# Altium footprint library MB1404.PcbLib: 69 footprints (part 4 of 5)
Each footprint in its own frame and in the unit in brackets; x right, y up, seen from the top. Pads: shape width x height; smd on the part's side, far side on the other; paste and mask are expansions set on the pad; w line width, h text height; cw(c..) or ccw(c..) is an arc to the next point about the centre after c.
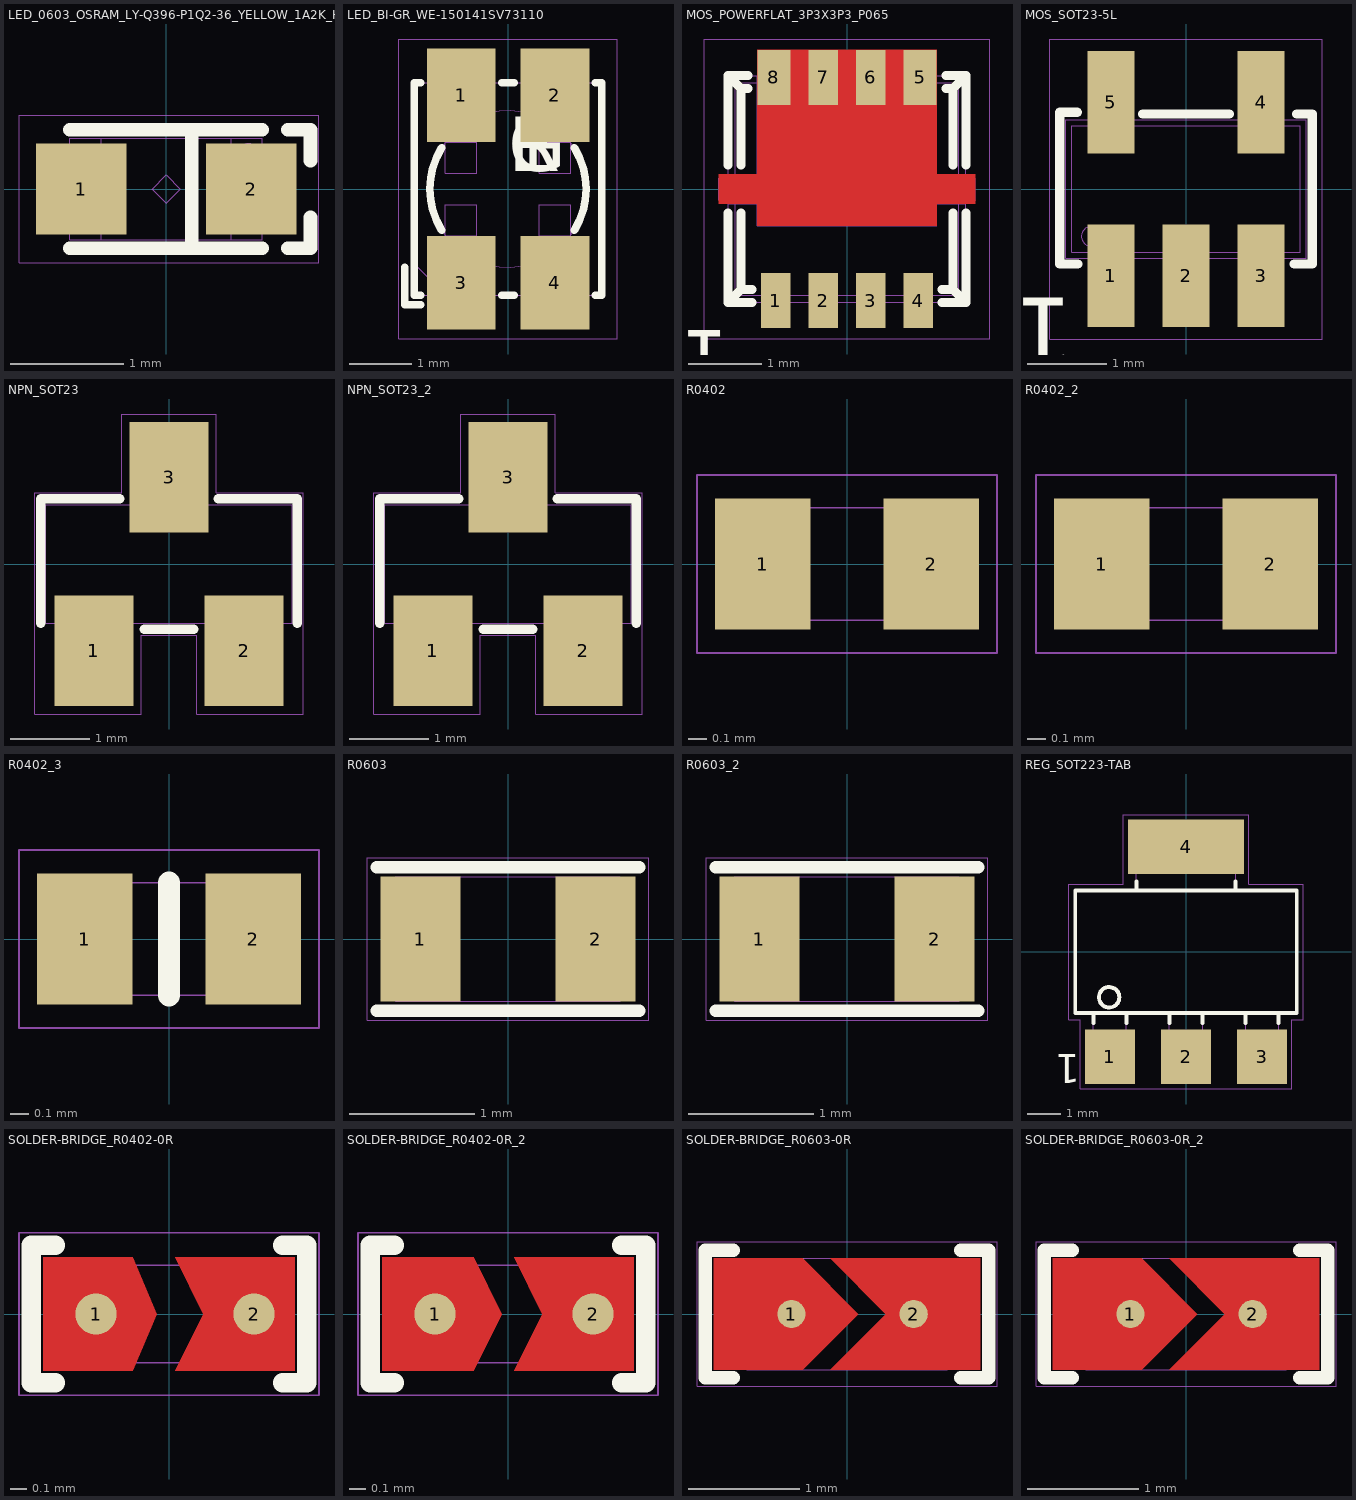
[diagram p3: the footprints below, top view; thin cyan lines are the x and y axes]

## LED_0603_OSRAM_LY-Q396-P1Q2-36_YELLOW_1A2K_H0P4 [mm]
height 0.4
pads (2):
  rect 0.8x0.8 smd mask+0.05: 1(-0.75,0) 2(0.75,0)
Top Overlay:
  lines w0.12: -0.85,-0.525 0.85,-0.525 ; -0.85,0.525 0.85,0.525 ; 0.225,-0.525 0.225,0.525 ; 1.075,-0.525 1.275,-0.525 1.275,-0.25 ; 1.075,0.525 1.275,0.525 1.275,0.25
Mechanical 14:
  circle w0.01: c0.725,0.3 r0.1
  lines w0.01: -0.575,-0.45 -0.575,0.45 ; 0.575,-0.45 0.575,0.45 ; -0.85,-0.45 -0.85,0.45 0.85,0.45 0.85,-0.45 -0.85,-0.45 ; -0.125,0 0,-0.125 0.125,0 0,0.125 -0.125,0
  text "K" at 0.9,-0.25 h0.75
  text "'.Designator'" at -4.528,-0.808 h0.75
Mechanical 16:
  lines w0.01: -1.3,-0.65 -1.3,0.65 -0.475,0.65 1.35,0.65 1.35,-0.65 -1.3,-0.65
3D body: height 0.1, standoff 0, extent -0.85,0.4 0.85,0.45
3D body: height 0.1, standoff 0, extent -0.85,-0.45 0.85,-0.4
3D body: height 0.1, standoff 0, extent -0.85,-0.4 -0.575,0.4
3D body: height 0.1, standoff 0, extent 0.575,-0.4 0.85,0.4
3D body: height 0.4, standoff 0, extent -0.575,-0.4 0.575,0.4
3D body: height 0.2, standoff 0, extent -0.35,-0.275 0.35,0.3

## LED_BI-GR_WE-150141SV73110 [mm] "MCD-02631"
height 2.1
pads (4):
  rect 1.1x1.5 smd mask+0.05: 1(-0.75,1.5) 2(0.75,1.5) 3(-0.75,-1.5) 4(0.75,-1.5)
Top Overlay:
  lines w0.12: -1.65,-1.25 -1.65,-1.85 -1.4,-1.85 ; -1.4,-1.7 -1.5,-1.7 -1.5,1.7 -1.4,1.7 ; -1.063,-0.658 cw(c0,0) -1.063,0.658 ; -0.1,-1.7 0.1,-1.7 ; -0.1,1.7 0.1,1.7 ; 1.063,-0.658 ccw(c0,0) 1.063,0.658 ; 1.4,-1.7 1.5,-1.7 1.5,1.7 1.4,1.7
  text "1" at 0,0 h1.5
  text "G" at 0,0 h1.5
  text "R" at 0,0 h1.5
Mechanical 14:
  circle w0.01: c0,0 r1.25
  lines w0.01: -1.5,-1.2 -1,-1.7 ; -1.15,-1.7 -1.15,-1.85 -0.35,-1.85 -0.35,-1.7 ; -1.15,1.7 -1.15,1.75 -1.15,1.85 -0.35,1.85 -0.35,1.75 -0.35,1.7 ; 0.35,-1.7 0.35,-1.75 0.35,-1.85 1.15,-1.85 1.15,-1.75 1.15,-1.7 ; 0.35,1.7 0.35,1.85 1.15,1.85 1.15,1.7 ; -1.5,-1.7 1.5,-1.7 1.5,1.7 -1.5,1.7 -1.5,-1.7 ; -1,-0.75 -1,-0.25 -0.5,-0.25 -0.5,-0.75 -1,-0.75 ; -1,0.25 -1,0.75 -0.5,0.75 -0.5,0.25 -1,0.25 ; 0.5,-0.75 1,-0.75 1,-0.25 0.5,-0.25 0.5,-0.75 ; 0.5,0.25 0.5,0.75 1,0.75 1,0.25 0.5,0.25
  text "R" at 0,0 h1.5
  text "'.Designator'" at 1.975,-0.421 h0.75
  text "G" at 0,0 h1.5
Mechanical 16:
  lines w0.01: -1.75,-2.4 -1.75,2.4 1.75,2.4 1.75,-2.4 -1.75,-2.4
3D body: height 2.1, standoff 1.7, extent -0.575,-0.725 -0.075,-0.225
3D body: height 2.1, standoff 1.7, extent 0.075,0.225 0.575,0.725
3D body: height 0.2, standoff 0, extent -1.15,0.75 -0.35,1.85
3D body: height 0.2, standoff 0, extent 0.35,0.75 1.15,1.85
3D body: height 0.2, standoff 0, extent 0.35,-1.85 1.15,-0.75
3D body: height 0.2, standoff 0, extent -1.15,-1.85 -0.35,-0.75
3D body: height 1, standoff 0, extent 0.35,-1.85 1.15,-1.7
3D body: height 1, standoff 0, extent -1.15,-1.85 -0.35,-1.7
3D body: height 1, standoff 0, extent -1.15,1.7 -0.35,1.85
3D body: height 1, standoff 0, extent 0.35,1.7 1.15,1.85
3D body: height 0.2, standoff 0.1, extent -1.5,-1.7 1.5,1.7
3D body: height 1.7, standoff 0.2, extent -1.5,-1.7 1.5,1.7
3D body: height 1.75, standoff 1.7, extent -0.575,-0.725 -0.075,-0.225
3D body: height 1.75, standoff 1.7, extent 0.075,0.225 0.575,0.725
3D body: height 2.1, standoff 1.7, extent 0,-1.7 1.5,1.7
3D body: height 2.1, standoff 1.7, extent -1.5,-1.7 0,1.7

## MOS_POWERFLAT_3P3X3P3_P065 [mm] "MCD-01126"
height 0.9
pads (8):
  rect 0.4x0.75 smd mask+0.05: 1(-0.975,-1.525) 2(-0.325,-1.525) 3(0.325,-1.525) 4(0.975,-1.525) 6(0.325,1.525) 7(-0.325,1.525)
  rect 0.45x0.75 smd mask+0.05: 5(1,1.525) 8(-1,1.525)
Top Layer:
  region: -1.755,0.2 -1.755,-0.2 -1.225,-0.2 -1.225,-0.5 1.225,-0.5 1.225,-0.2 1.755,-0.2 1.755,0.2 1.225,0.2 1.225,1.9 -1.225,1.9 -1.225,0.2
Top Overlay:
  lines w0.12: -1.625,-0.325 -1.625,-1.55 ; -1.625,0.325 -1.625,1.55 ; -1.45,-0.325 -1.45,-1.375 ; -1.45,0.325 -1.45,1.375 ; -1.35,1.375 -1.45,1.375 ; -1.35,1.55 -1.625,1.55 ; -1.3,-1.55 -1.625,-1.55 ; -1.3,-1.375 -1.45,-1.375 ; 1.3,-1.55 1.625,-1.55 ; 1.3,-1.375 1.45,-1.375 ; 1.35,1.375 1.45,1.375 ; 1.35,1.55 1.625,1.55 ; 1.45,-0.325 1.45,-1.375 ; 1.45,0.325 1.45,1.375 ; 1.625,-0.325 1.625,-1.55 ; 1.625,0.325 1.625,1.55 ; -1.625,-1.55 -1.45,-1.375 ; -1.625,1.55 -1.45,1.375 ; -1.45,-1.375 -1.45,-1.375 ; 1.45,-1.375 1.45,-1.375 ; 1.45,-1.375 1.625,-1.55 ; 1.45,1.375 1.625,1.55
  text "1" at -1.6,-1.675 h1.3
Mechanical 14:
  lines w0.01: -1.625,-0.15 -1.75,-0.15 -1.75,0.15 -1.625,0.15 ; -1.125,-1.55 -1.125,-1.75 -0.825,-1.75 -0.825,-1.55 ; -1.125,1.55 -1.125,1.75 -0.825,1.75 -0.825,1.55 ; -0.475,-1.55 -0.475,-1.75 -0.175,-1.75 -0.175,-1.55 ; -0.475,1.55 -0.475,1.75 -0.175,1.75 -0.175,1.55 ; 0.175,-1.55 0.175,-1.75 0.475,-1.75 0.475,-1.55 ; 0.175,1.55 0.175,1.75 0.475,1.75 0.475,1.55 ; 0.825,-1.55 0.825,-1.75 1.125,-1.75 1.125,-1.55 ; 0.825,1.55 0.825,1.75 1.125,1.75 1.125,1.55 ; 1.625,-0.15 1.75,-0.15 1.75,0.15 1.625,0.15 ; -1.625,-1.55 1.625,-1.55 ; -1.625,-1.55 -1.625,1.55 ; -1.625,-1.55 -1.525,-1.45 ; -1.625,1.55 1.625,1.55 ; -1.625,1.55 -1.525,1.45 ; -1.525,-1.45 -1.525,1.45 ; -1.525,-1.45 -1.45,-1.45 1.525,-1.45 ; -1.525,1.45 1.525,1.45 ; 1.525,-1.45 1.525,1.45 ; 1.525,-1.45 1.625,-1.55 ; 1.525,1.45 1.625,1.55 ; 1.625,-1.55 1.625,1.55 ; -1.625,-0.2 -1.225,-0.2 -1.225,-0.5 0,-0.5 1.225,-0.5 1.225,-0.2 1.625,-0.2 1.625,0.2 1.225,0.2 1.225,1.55 -0.35,1.55 -1.225,1.55 -1.225,0.2 -1.625,0.2 -1.625,-0.2
  text "8" at -1.075,1.075 h0.5
  text "7" at -0.425,1.075 h0.5
  text "6" at 0.225,1.075 h0.5
  text "5" at 0.9,1.075 h0.5
  text "4" at 0.85,-1.4 h0.5
  text "3" at 0.225,-1.4 h0.5
  text "2" at -0.425,-1.4 h0.5
  text "1" at -1.05,-1.4 h0.5
  text "'.Designator'" at 0.8,-4.25 h0.75
Mechanical 16:
  lines w0.01: 1.95,-2.05 -1.075,-2.05 -1.95,-2.05 -1.95,-0.225 -1.95,2.05 1.5,2.05 1.95,2.05 1.95,-2.05 ; 1.95,-2.05 1.95,-2.05
3D body: height 0.2, standoff 0, extent -1.125,1.55 -0.825,1.75
3D body: height 0.2, standoff 0, extent -0.475,1.55 -0.175,1.75
3D body: height 0.2, standoff 0, extent 0.175,1.55 0.475,1.75
3D body: height 0.2, standoff 0, extent 0.825,1.55 1.125,1.75
3D body: height 0.2, standoff 0, extent 0.825,-1.75 1.125,-1.55
3D body: height 0.2, standoff 0, extent 0.175,-1.75 0.475,-1.55
3D body: height 0.2, standoff 0, extent -0.475,-1.75 -0.175,-1.55
3D body: height 0.2, standoff 0, extent -1.125,-1.75 -0.825,-1.55
3D body: height 0.2, standoff 0, extent -1.75,-0.15 -1.625,0.15
3D body: height 0.9, standoff 0, extent -1.625,-1.55 1.625,1.55
3D body: height 0.2, standoff 0, extent 1.625,-0.15 1.75,0.15
3D body: height 0.91, standoff 0.9, extent -1.398,-1.325 -1,-0.925

## MOS_SOT23-5L [mm]
height 1.45
pads (5):
  rect 0.6x1.3 smd mask+0.05: 1(-0.95,-1.1) 2(0,-1.1) 3(0.95,-1.1) 4(0.95,1.1) 5(-0.95,1.1)
Top Overlay:
  lines w0.12: -1.375,0.975 -1.6,0.975 -1.6,-0.95 -1.372,-0.95 ; -0.55,0.95 0.55,0.95 ; 1.372,-0.95 1.6,-0.95 1.6,0.95 1.4,0.95
  text "1" at -1.409,-1.086 h1.5
Mechanical 14:
  circle w0.01: c-1.2,-0.6 r0.125
  lines w0.01: -1.15,-0.875 -1.15,-1.5 -0.75,-1.5 -0.75,-0.875 ; -1.15,0.875 -1.15,1.5 -0.75,1.5 -0.75,0.875 ; -0.2,-0.875 -0.2,-1.5 0.2,-1.5 0.2,-0.875 ; 0.75,-0.875 0.75,-1.5 1.15,-1.5 1.15,-0.875 ; 0.75,0.875 0.75,1.5 1.15,1.5 1.15,0.875 ; -1.525,-0.875 -1.525,0.875 1.525,0.875 1.525,-0.875 -1.525,-0.875 ; -1.45,-0.8 1.45,-0.8 1.45,0.8 -1.45,0.8 -1.45,-0.8
  text "'.Designator'" at 4.441,0.814 h0.75
Mechanical 16:
  lines w0.01: -1.725,-1.9 -1.725,1.9 1.725,1.9 1.725,-1.9 -1.725,-1.9
3D body "SOT23-5L.STEP": height 1.1, standoff 0, extent -1.5,-1.25 1.5,1.25
3D body: height 1.45, standoff 0, extent -1.524,-0.874 1.524,0.874

## NPN_SOT23 [mm]
height 1.1
pads (3):
  rect 1x1.4 smd mask+0.05: 1(-0.95,-1.1) 2(0.95,-1.1) 3(0,1.1)
Top Overlay:
  lines w0.12: -1.625,-0.75 -1.625,0.825 -0.624,0.825 ; -0.312,-0.825 0.312,-0.825 ; 0.624,0.825 1.625,0.825 1.625,-0.75
Mechanical 14:
  lines w0.01: -1.56,-0.75 1.56,-0.75 1.56,0.75 -1.56,0.75 -1.56,-0.75 ; -1.275,-1.025 -1.275,-0.75 -0.675,-0.75 -0.675,-1.025 -1.275,-1.025 ; -0.25,0.75 -0.25,1.05 0.325,1.05 0.325,0.75 -0.25,0.75 ; 0.65,-1.025 0.65,-0.75 1.25,-0.75 1.25,-1.025 0.65,-1.025
  text "'.Designator'" at -4.325,-0.775 h0.75
Mechanical 16:
  lines w0.01: -1.7,-1.9 -1.7,0.9 -0.6,0.9 -0.6,1.9 0.6,1.9 0.6,0.9 1.7,0.9 1.7,-1.9 0.35,-1.9 0.35,-0.9 -0.35,-0.9 -0.35,-1.9 -1.7,-1.9
3D body "SOT23-3_TO-236AB.STEP": height 1.09, standoff 0, extent -1.5,-1.25 1.5,1.25
3D body: height 1.1, standoff 0, extent -1.559,-0.749 1.559,0.749

## NPN_SOT23_2 [mm]
pads (3):
  rect 1x1.4 smd mask+0.05: 1(-0.95,-1.1) 2(0.95,-1.1) 3(0,1.1)
Top Overlay:
  lines w0.12: -1.625,-0.75 -1.625,0.825 -0.624,0.825 ; -0.312,-0.825 0.312,-0.825 ; 0.624,0.825 1.625,0.825 1.625,-0.75
Mechanical 14:
  lines w0.01: -1.56,-0.75 1.56,-0.75 1.56,0.75 -1.56,0.75 -1.56,-0.75 ; -1.275,-1.025 -1.275,-0.75 -0.675,-0.75 -0.675,-1.025 -1.275,-1.025 ; -0.25,0.75 -0.25,1.05 0.325,1.05 0.325,0.75 -0.25,0.75 ; 0.65,-1.025 0.65,-0.75 1.25,-0.75 1.25,-1.025 0.65,-1.025
  text "'.Designator'" at -4.325,-0.775 h0.75
Mechanical 16:
  lines w0.01: -1.7,-1.9 -1.7,0.9 -0.6,0.9 -0.6,1.9 0.6,1.9 0.6,0.9 1.7,0.9 1.7,-1.9 0.35,-1.9 0.35,-0.9 -0.35,-0.9 -0.35,-1.9 -1.7,-1.9
3D body "SOT23-3_TO-236AB.STEP": height 1.09, standoff 0, extent -1.5,-1.25 1.5,1.25
3D body: height 1.1, standoff 0, extent -1.559,-0.749 1.559,0.749

## R0402 [mm]
height 0.4
pads (2):
  rect 0.51x0.7 smd mask+0.05: 1(-0.45,0) 2(0.45,0)
Mechanical 14:
  lines w0.01: -0.45,-0.3 0.45,-0.3 0.45,0.3 -0.45,0.3 -0.45,-0.3
  text "'.Designator'" at -2,-0.5 h0.75
Mechanical 16:
  lines w0.01: -0.8,-0.475 -0.8,0.475 0.8,0.475 0.8,-0.475 -0.8,-0.475
3D body "R0402.STEP": height 0.34, standoff 0, extent -0.52,-0.3 0.52,0.3
3D body: height 0.4, standoff 0, extent -0.455,-0.305 0.455,0.305

## R0402_2 [mm]
pads (2):
  rect 0.51x0.7 smd mask+0.05: 1(-0.45,0) 2(0.45,0)
Mechanical 14:
  lines w0.01: -0.45,-0.3 0.45,-0.3 0.45,0.3 -0.45,0.3 -0.45,-0.3
  text "'.Designator'" at 1.925,0.475 h0.75
Mechanical 16:
  lines w0.01: -0.8,-0.475 -0.8,0.475 0.8,0.475 0.8,-0.475 -0.8,-0.475
3D body "R0402.STEP": height 0.34, standoff 0, extent -0.52,-0.3 0.52,0.3
3D body: height 0.4, standoff 0, extent -0.455,-0.305 0.455,0.305

## R0402_3 [mm]
pads (2):
  rect 0.51x0.7 smd mask+0.05: 1(-0.45,0) 2(0.45,0)
Top Overlay:
  lines w0.12: 0,-0.3 0,0.3
Mechanical 14:
  lines w0.01: -0.45,-0.3 -0.45,0.3 0.45,0.3 0.45,-0.3 -0.45,-0.3
  text "'.Designator'" at 4.404,0.834 h0.75
Mechanical 16:
  lines w0.01: -0.8,-0.475 0.8,-0.475 0.8,0.475 -0.8,0.475 -0.8,-0.475
3D body: height 0.4, standoff 0, extent -0.455,-0.305 0.455,0.305
3D body "R0402.STEP": height 0.34, standoff 0, extent -0.52,-0.3 0.52,0.3

## R0603 [mm]
height 0.55
pads (2):
  rect 0.64x1 smd mask+0.05: 1(-0.7,0) 2(0.7,0)
Top Overlay:
  lines w0.1: -1.05,-0.575 1.05,-0.575 ; -1.05,0.575 1.05,0.575
Top Paste:
  rectangle: -1.02,-0.5 -0.38,0.5
  rectangle: 0.38,-0.5 1.02,0.5
Mechanical 14:
  lines w0.01: -0.9,-0.5 -0.9,0.5 0.9,0.5 0.9,-0.5 -0.9,-0.5
  text "'.Designator'" at 4.459,0.829 h0.75
Mechanical 16:
  lines w0.01: -1.125,-0.65 1.125,-0.65 1.125,0.65 -1.125,0.65 -1.125,-0.65
3D body "R0603.STEP": height 0.56, standoff 0, extent -0.85,-0.4 0.85,0.4
3D body: height 0.55, standoff 0, extent -0.905,-0.505 0.905,0.505

## R0603_2 [mm]
pads (2):
  rect 0.64x1 smd mask+0.05: 1(-0.7,0) 2(0.7,0)
Top Overlay:
  lines w0.1: -1.05,-0.575 1.05,-0.575 ; -1.05,0.575 1.05,0.575
Top Paste:
  rectangle: -1.02,-0.5 -0.38,0.5
  rectangle: 0.38,-0.5 1.02,0.5
Mechanical 14:
  lines w0.01: -0.9,-0.5 -0.9,0.5 0.9,0.5 0.9,-0.5 -0.9,-0.5
  text "'.Designator'" at 4.461,0.767 h0.75
Mechanical 16:
  lines w0.01: -1.125,-0.65 1.125,-0.65 1.125,0.65 -1.125,0.65 -1.125,-0.65
3D body "R0603.STEP": height 0.56, standoff 0, extent -0.85,-0.4 0.85,0.4
3D body: height 0.55, standoff 0, extent -0.905,-0.505 0.905,0.505

## REG_SOT223-TAB [mm]
height 1.8
pads (4):
  rect 1.5x1.65 smd mask+0.05: 1(-2.3,-3.175) 2(0,-3.175) 3(2.3,-3.175)
  rect 3.5x1.65 smd mask+0.05: 4(0,3.175)
Top Overlay:
  circle w0.12: c-2.325,-1.375 r0.309
  lines w0.12: -2.8,-2.15 -2.8,-1.85 -1.8,-1.85 -1.8,-2.15 ; -1.5,2.125 -1.5,1.85 1.5,1.85 1.5,2.125 ; -0.5,-2.15 -0.5,-1.85 0.5,-1.85 0.5,-2.15 ; 1.8,-2.15 1.8,-1.85 2.8,-1.85 2.8,-2.15 ; -3.35,-1.85 3.35,-1.85 3.35,1.85 -3.35,1.85 -3.35,-1.85
  text "1" at -3.196,-2.816 h1.5
Mechanical 14:
  circle w0.01: c-2.325,-1.375 r0.285
  lines w0.01: -3.35,-1.85 3.35,-1.85 3.35,1.85 -3.35,1.85 -3.35,-1.85 ; -2.8,-3.65 -2.8,-1.85 -1.8,-1.85 -1.8,-3.65 -2.8,-3.65 ; -1.5,1.85 -1.5,3.65 1.5,3.65 1.5,1.85 -1.5,1.85 ; -0.5,-3.65 -0.5,-1.85 0.5,-1.85 0.5,-3.65 -0.5,-3.65 ; 1.8,-3.65 1.8,-1.85 2.8,-1.85 2.8,-3.65 1.8,-3.65
  text "4" at -0.325,2.375 h1.5
  text "1" at -2.5,-3.35 h1.5
  text "2" at -0.35,-3.375 h1.5
  text "3" at 1.95,-3.4 h1.5
  text "'.Designator'" at 4.654,0.934 h0.75
Mechanical 16:
  lines w0.01: -3.55,-2.05 -3.2,-2.05 -3.2,-4.15 3.2,-4.15 3.2,-2.05 3.55,-2.05 3.55,2.05 1.9,2.05 1.9,4.15 -1.9,4.15 -1.9,2.05 -3.55,2.05 -3.55,-2.05
3D body: height 1.8, standoff 0, extent -3.349,-1.849 3.349,1.849
3D body "SOT223.STEP": height 1.68, standoff 0, extent -3.25,-3.48 3.25,3.48

## SOLDER-BRIDGE_R0402-0R [mil] "MCD-01619"
height 13.78
pads (2):
  round 10 smd paste-393.7: 1(-17.72,0) 2(20.67,0)
Top Layer:
  region: 1.48,13.78 8.37,0 1.48,-13.78 30.51,-13.78 30.51,13.78
  region: -30.51,-13.78 -30.51,13.78 -8.86,13.78 -2.95,0 -8.86,-13.78
Top Overlay:
  lines w4.72: -27.56,-16.73 -33.46,-16.73 -33.46,16.73 -27.56,16.73 ; 27.56,-16.73 33.46,-16.73 33.46,16.73 27.56,16.73
Top Paste:
  rectangle: 8.37,-13.77 27.56,13.79
  rectangle: -27.56,-13.77 -8.36,13.79
Top Solder:
  region: 5.41,0 -2.46,15.75 29.53,15.75 29.53,-15.75 -2.46,-15.75
  region: -29.53,15.75 -6.89,15.75 0,0 -6.89,-15.75 -29.53,-15.75
Mechanical 14:
  lines w0.39: -17.72,-11.81 17.72,-11.81 17.72,11.81 -17.72,11.81 -17.72,-11.81
  text "'.Designator'" at -78.74,-19.68 h29.53
Mechanical 16:
  lines w0.39: -36.42,-19.68 36.42,-19.68 36.42,19.68 -36.42,19.68 -36.42,-19.68
3D body: height 13.78, standoff 0, extent -17.72,-11.81 17.72,11.81
3D body "R0402.STEP": height 13.39, standoff 0, extent -20.47,-11.81 20.48,11.81

## SOLDER-BRIDGE_R0402-0R_2 [mil]
pads (2):
  round 10 smd paste-393.7: 1(-17.72,0) 2(20.67,0)
Top Layer:
  region: -30.51,-13.78 -30.51,13.78 -8.37,13.78 -1.48,0 -8.37,-13.78
  region: 1.48,13.78 8.37,0 1.48,-13.78 30.51,-13.78 30.51,13.78
Top Overlay:
  lines w4.72: -27.56,-16.73 -33.46,-16.73 -33.46,16.73 -27.56,16.73 ; 27.56,-16.73 33.46,-16.73 33.46,16.73 27.56,16.73
Top Paste:
  rectangle: -27.54,-13.78 -8.35,13.78
  rectangle: 8.38,-13.78 27.57,13.78
Top Solder:
  region: -29.53,15.75 -6.4,15.75 1.48,0 -6.4,-15.75 -29.53,-15.75
  region: 5.41,0 -2.46,15.75 29.53,15.75 29.53,-15.75 -2.46,-15.75
Mechanical 14:
  lines w0.39: -17.72,-11.81 -17.72,11.81 17.72,11.81 17.72,-11.81 -17.72,-11.81
  text "'.Designator'" at -78.74,-19.68 h29.53
Mechanical 16:
  lines w0.39: -36.42,-19.68 -36.42,19.68 36.42,19.68 36.42,-19.68 -36.42,-19.68
3D body "R0402.STEP": height 13.39, standoff 0, extent -20.47,-11.81 20.48,11.81
3D body: height 13.78, standoff 0, extent -17.72,-11.81 17.72,11.81

## SOLDER-BRIDGE_R0603-0R [mil]
height 19.68
pads (2):
  round 10 smd paste-393.7 mask+4: 1(-19.68,0) 2(23.62,0)
Top Layer:
  region: -47.24,-19.68 -47.24,19.68 -15.75,19.68 3.94,0 -15.75,-19.68
  region: -5.91,19.68 13.78,0 -5.91,-19.68 47.24,-19.68 47.24,19.68
Top Overlay:
  lines w4.72: -40.35,-22.64 -50.2,-22.64 -50.2,6.89 -50.2,22.64 -40.35,22.64 ; 40.35,-22.64 50.2,-22.64 50.2,22.64 40.35,22.64
Top Paste:
  rectangle: 14.96,-19.68 40.16,19.68
  rectangle: -40.16,-19.68 -14.96,19.68
Top Solder:
  region: -42.32,21.65 -14.76,21.65 6.89,0 -14.76,-21.65 -42.32,-21.65
  region: 10.83,0 -10.83,21.65 42.32,21.65 42.32,-21.65 -10.83,-21.65
Mechanical 14:
  lines w0.39: -35.43,-19.68 -35.43,19.68 35.43,19.68 35.43,-19.68 -35.43,-19.68
  text "'.Designator'" at -181.1,-30.51 h29.53
Mechanical 16:
  lines w0.39: -53.15,-25.59 -53.15,25.59 -7.87,25.59 53.15,25.59 53.15,-25.59 -53.15,-25.59
3D body "R0603.STEP": height 22.05, standoff 0, extent -33.46,-15.74 33.47,15.75
3D body: height 19.68, standoff 0, extent -35.63,-19.88 35.63,19.88

## SOLDER-BRIDGE_R0603-0R_2 [mil]
pads (2):
  round 10 smd paste-393.7 mask+4: 1(-19.68,0) 2(23.62,0)
Top Layer:
  region: -47.24,-19.68 -47.24,19.68 -15.75,19.68 3.94,0 -15.75,-19.68
  region: -5.91,19.68 13.78,0 -5.91,-19.68 47.24,-19.68 47.24,19.68
Top Overlay:
  lines w4.72: -40.35,-22.64 -50.2,-22.64 -50.2,6.89 -50.2,22.64 -40.35,22.64 ; 40.35,-22.64 50.2,-22.64 50.2,22.64 40.35,22.64
Top Paste:
  rectangle: 14.95,-19.68 40.15,19.68
  rectangle: -40.15,-19.68 -14.95,19.68
Top Solder:
  region: -42.32,21.65 -14.76,21.65 6.89,0 -14.76,-21.65 -42.32,-21.65
  region: 10.83,0 -10.83,21.65 42.32,21.65 42.32,-21.65 -10.83,-21.65
Mechanical 14:
  lines w0.39: -35.43,-19.68 -35.43,19.68 35.43,19.68 35.43,-19.68 -35.43,-19.68
  text "'.Designator'" at -178.9,-33.7 h29.53
Mechanical 16:
  lines w0.39: -53.15,-25.59 -53.15,25.59 -7.87,25.59 53.15,25.59 53.15,-25.59 -53.15,-25.59
3D body "R0603.STEP": height 22.05, standoff 0, extent -33.46,-15.74 33.47,15.75
3D body: height 19.68, standoff 0, extent -35.63,-19.88 35.63,19.88